# Altium schematic symbol library SCHLIB.SchLib: 2608 symbols (part 4 of 20) (continued)
## F-PTC FUSE (continued)
footprint F-2920
pins: 1, 2

## F-PTC FUSE 3A
designator F?, comment Termination: Radial  Trip Current: 6A  (hidden comment: 30R300UU)
PTC RESET FUSE 30V 3A RADIAL; Manufacturer: Littelfuse; Power Dissipation: 2W; Current Rating: 40A; Resistance: 80mR; Time to Trip: 10.8s; Approvals: cULus,TUV; Washability: OK; Supplier 1: Digi-Key; Supplier Part Number 1: F2026-ND; Manufacturer Part Number: 30R300UU; Stock 1: 2309; Pricing 1: 1=0.58, 5=0.562, 10=0.545, 50=0.4584, 100=0.3806, 250=0.346, 500=0.2941, 1000=0.2595, 5000=0.23355 (USD); Case/Package: Radial; Min Operating Temperature: -40°C; Max Operating Temperature: 85°C; Package Quantity: 500; Packaging: Bulk; Operating Supply Voltage: 30V; Max Current Rating: 40A; Max Voltage Rating (DC): 30V; Working Voltage: 30V; Voltage Rating (DC): 30V; Hold Current: 3A; Height: 7.27mm; Width: 11.4mm; Lead Pitch: 5.1mm; Thickness: 3.05mm; Lead Free: Lead Free; REACH SVHC: No SVHC; ComponentLink1URL: http://www.littelfuse.com/~/media/electronics/datasheets/resettable_ptcs/littelfuse_ptc_30r_datasheet.pdf.pdf?src-supplier=Digi-Key; ComponentLink1Description: http://www.littelfuse.com/~/media/electronics/datasheets/resettable_ptcs/littelfuse_ptc_30r_datasheet.pdf.pdf?src-supplier=Digi-Key; ComponentLink2URL: https://www.verical.com/server-webapp/html/getDatasheet?partID=228806&src-supplier=Verical; ComponentLink2Description: https://www.verical.com/server-webapp/html/getDatasheet?partID=228806&src-supplier=Verical; ComponentLink3URL: http://www.farnell.com/datasheets/578253.pdf?src-supplier=Element14; ComponentLink3Description: http://www.farnell.com/datasheets/578253.pdf?src-supplier=Element14; ComponentLink4URL: http://www.farnell.com/datasheets/656941.pdf?src-supplier=Element14; ComponentLink4Description: http://www.farnell.com/datasheets/656941.pdf?src-supplier=Element14
footprint Radial 5.1mm Lead (Poly Puse)
pins: 1, 2

## F-PTC-150mA-1206
designator F?, comment Hold Current: 50mA  Case/Package: 1206  (hidden comment: 150mA)
PTC RESET FUSE 60V 50MA 1206; Manufacturer: Bel; Manufacturer Part Number: 0ZCJ0005FF2E; Power Dissipation: 400mW; Max Current Rating: 10A; Time to Trip: 1.5s; Approvals: UL,TUV; Supplier 1: Digi-Key; Supplier Part Number 1: 507-1793-1-ND; Stock: 502454; Pricing: 1=0.11, 5=0.108, 10=0.104, 50=0.0928, 100=0.0864, 250=0.0768, 500=0.064, 1000=0.0608 (USD); RoHS: Yes; Mount: Surface Mount; Case Code (Metric): 3216; Contact Plating: Tin,Matte; Number of Terminals: 2; Case Code (Imperial): 1206; Min Operating Temperature: -40°C; Max Operating Temperature: 85°C; Max Voltage Rating (DC): 60V; Package Quantity: 1; Packaging: Tape and Reel; Trip Current: 150mA; Lead Free: Lead Free; ComponentLink1URL: https://datasheet.ciiva.com/18550/0zcj-18550517.pdf?src-supplier=Digi-Key; ComponentLink1Description: https://datasheet.ciiva.com/18550/0zcj-18550517.pdf?src-supplier=Digi-Key; ComponentLink2URL: https://datasheet.ciiva.com/18550/0zcj-18550518.pdf?src-supplier=Digi-Key; ComponentLink2Description: https://datasheet.ciiva.com/18550/0zcj-18550518.pdf?src-supplier=Digi-Key; ComponentLink3URL: https://datasheet.ciiva.com/18550/0zcj-18550519.pdf?src-supplier=Digi-Key; ComponentLink3Description: https://datasheet.ciiva.com/18550/0zcj-18550519.pdf?src-supplier=Digi-Key
footprint F-1206
pins: 1, 2

## F-PTC-160mA-1206
designator F?, comment 160mA  Case/Package: 1206
PTC RESET FUSE 48V 160MA 1206; Manufacturer: Bel; Manufacturer Part Number: 0ZCJ0016FF2E; Trip Current: 450mA; Time to Trip: 0.3s; Max Current Rating: 10A; Supplier 1: Avnet; Stock 1: 3000; Pricing 1: 3000=0,05539, 6000=0,05364, 12000=0,05112, 18000=0,04968, 24000=0,04788 (USD); RoHS: Yes; Mount: Surface Mount; Case Code (Imperial): 1206; Case Code (Metric): 3216; Contact Plating: Tin,Matte; Min Operating Temperature: -40°C; Max Operating Temperature: 85°C; Package Quantity: 1; Packaging: Tape and Reel; Lead Free: Lead Free; ComponentLink1URL: https://datasheet.ciiva.com/18550/0zcj-18550534.pdf?src-supplier=Digi-Key; ComponentLink1Description: https://datasheet.ciiva.com/18550/0zcj-18550534.pdf?src-supplier=Digi-Key; ComponentLink2URL: https://datasheet.ciiva.com/18550/0zcj-18550535.pdf?src-supplier=Digi-Key; ComponentLink2Description: https://datasheet.ciiva.com/18550/0zcj-18550535.pdf?src-supplier=Digi-Key; ComponentLink3URL: https://datasheet.ciiva.com/18550/0zcj-18550536.pdf?src-supplier=Digi-Key; ComponentLink3Description: https://datasheet.ciiva.com/18550/0zcj-18550536.pdf?src-supplier=Digi-Key; Supplier Part Number 1: 0ZCJ0016FF2E; Hold Current: 160mA
footprint L-1206
pins: 1, 2

## F-PTC-200mA
designator F?, comment Hold Current: 200mA  Case Code (Imperial): 1210  (hidden comment: MF-USMF020-2)
PTC RESET FUSE 30V 200MA 1210; Manufacturer: Bourns; Current Rating: 10A; Resistance: 5R; Power Dissipation: 600mW; Trip Current: 400mA; Time to Trip: 0.02s; Approvals: UL,CSA,TUV; Washability: OK; Supplier 1: Digi-Key; Manufacturer Part Number: MF-USMF020-2; Stock 1: 35052; Pricing 1: 1=0.37000, 5=0.35800, 10=0.34700, 50=0.29160, 100=0.24200, 250=0.22000, 500=0.18700, 1000=0.16500 (USD); RoHS: Yes; Mount: Surface Mount,PCB; Case/Package: 1210; Case Code (Metric): 3225; Number of Terminals: 2; Contact Plating: Gold; Terminal Material: Gold; Min Operating Temperature: -40°C; Max Operating Temperature: 85°C; Packaging: Tape and Reel; Package Quantity: 3000; Voltage Rating (DC): 30V; Max Current Rating: 10A; Operating Supply Voltage: 30V; Voltage Rating: 30V; Termination: SMD/SMT; Voltage Rating (AC): 30V; Length: 3.43mm; Height: 1.1mm; Width: 2.8mm; Radiation Hardening: No; REACH SVHC: No SVHC; Lead Free: Lead Free; ComponentLink1URL: https://datasheet.ciiva.com/34302/1164971-34302049.pdf?src-supplier=Jameco; ComponentLink1Description: https://datasheet.ciiva.com/34302/1164971-34302049.pdf?src-supplier=Jameco; ComponentLink2URL: https://datasheet.ciiva.com/326/mfusmf-326435.pdf?src-supplier=Digi-Key; ComponentLink2Description: https://datasheet.ciiva.com/326/mfusmf-326435.pdf?src-supplier=Digi-Key; ComponentLink3URL: https://datasheet.ciiva.com/326/mfusmf-326436.pdf?src-supplier=Digi-Key; ComponentLink3Description: https://datasheet.ciiva.com/326/mfusmf-326436.pdf?src-supplier=Digi-Key; ComponentLink4URL: https://datasheet.ciiva.com/326/mfusmf-326437.pdf?src-supplier=Digi-Key; ComponentLink4Description: https://datasheet.ciiva.com/326/mfusmf-326437.pdf?src-supplier=Digi-Key; ComponentLink5URL: https://datasheet.ciiva.com/3019/mfusmf-3019685.pdf?src-supplier=Avnet; ComponentLink5Description: https://datasheet.ciiva.com/3019/mfusmf-3019685.pdf?src-supplier=Avnet; ComponentLink6URL: https://datasheet.ciiva.com/8005/mfusmf-8005477.pdf?src-supplier=Element14; ComponentLink6Description: https://datasheet.ciiva.com/8005/mfusmf-8005477.pdf?src-supplier=Element14; ComponentLink7URL: https://datasheet.ciiva.com/3019/mfusmf-3019686.pdf?src-supplier=Avnet; ComponentLink7Description: https://datasheet.ciiva.com/3019/mfusmf-3019686.pdf?src-supplier=Avnet; ComponentLink8URL: https://datasheet.ciiva.com/30081/mfusmf-30081990.pdf?src-supplier=Onlinecomponents.com; ComponentLink8Description: https://datasheet.ciiva.com/30081/mfusmf-30081990.pdf?src-supplier=Onlinecomponents.com; ComponentLink9URL: https://datasheet.ciiva.com/32438/mf-usmf-series-eng-tds-32438758.pdf?src-supplier=Distrelec; ComponentLink9Description: https://datasheet.ciiva.com/32438/mf-usmf-series-eng-tds-32438758.pdf?src-supplier=Distrelec; ComponentLink10URL: https://datasheet.ciiva.com/46433/1869950-46433750.pdf?src-supplier=Element14; ComponentLink10Description: https://datasheet.ciiva.com/46433/1869950-46433750.pdf?src-supplier=Element14; ComponentLink11URL: https://datasheet.ciiva.com/46433/1869950-46433751.pdf?src-supplier=Element14; ComponentLink11Description: https://datasheet.ciiva.com/46433/1869950-46433751.pdf?src-supplier=Element14; ComponentLink12URL: https://datasheet.ciiva.com/22712/48621-22712232.pdf?src-supplier=Element14; ComponentLink12Description: https://datasheet.ciiva.com/22712/48621-22712232.pdf?src-supplier=Element14; ComponentLink13URL: https://datasheet.ciiva.com/14538/70153608-14538687.pdf?src-supplier=Allied+Electronics; ComponentLink13Description: https://datasheet.ciiva.com/14538/70153608-14538687.pdf?src-supplier=Allied+Electronics; Supplier Part Number 1: MF-USMF020-2CT-ND
footprint F-1210 (PTC Resettable Fuse, Body 3.215mmx2.575mm, BOURNS MF-USMF Series)
pins: 1, 2

## FB-BLM15AG100SH1D
designator FB?  Current Rating: 1A  Package: 0402
FERRITE BEAD 10 OHM 0402 1LN; Manufacturer Part Number: BLM15AG100SH1D; Manufacturer: Murata Electronics; Number of Lines: 1; Impedance @ Frequency: 10 Ohms @ 100 MHz; DCR: 50mOhm; Object  Type: Part; Design Item ID: FB-BLM15AG100SH1D; Series: BLM15; Filter Type: -; Ratings: AEC-Q200; Operating Temperature: -55°C ~ 125°C; Mounting Type: Surface Mount; Height: 0.55mm; Size: 1.00mm x 0.50mm; Category: Bead
footprint FB0402
pins: 1, 2

## FB-BLM15AG102SH1D
designator FB?  Current Rating: 200mA  Package: 0402
FERRITE BEAD 1 KOHM 0402 1LN; Manufacturer Part Number: BLM15AG102SH1D; Manufacturer: Murata Electronics; Number of Lines: 1; Impedance @ Frequency: 1 kOhms @ 100 MHz; DCR: 1Ohm; Object  Type: Part; Design Item ID: FB-BLM15AG102SH1D; Series: BLM15; Filter Type: -; Ratings: AEC-Q200; Operating Temperature: -55°C ~ 125°C; Mounting Type: Surface Mount; Height: 0.55mm; Size: 1.00mm x 0.50mm; Category: Bead
footprint FB0402
pins: 1, 2

## FB-BLM15AG102SZ1D
designator FB?  Current Rating: 300mA  Package: 0402
FERRITE BEAD 1 KOHM 0402 1LN; Manufacturer Part Number: BLM15AG102SZ1D; Manufacturer: Murata Electronics; Filter Type: Signal Line; Number of Lines: 1; Impedance @ Frequency: 1 kOhms @ 100 MHz; DCR: 650mOhm; Object  Type: Part; Design Item ID: FB-BLM15AG102SZ1D; Series: BLM15; Ratings: AEC-Q200; Operating Temperature: -55°C ~ 125°C; Mounting Type: Surface Mount; Height: 0.55mm; Size: 1.00mm x 0.50mm; Category: Bead
footprint FB0402
pins: 1, 2

## FB-BLM15AG121SH1D
designator FB?  Current Rating: 500mA  Package: 0402
FERRITE BEAD 120 OHM 0402 1LN; Manufacturer Part Number: BLM15AG121SH1D; Manufacturer: Murata Electronics; Number of Lines: 1; Impedance @ Frequency: 120 Ohms @ 100 MHz; DCR: 250mOhm; Object  Type: Part; Design Item ID: FB-BLM15AG121SH1D; Series: BLM15; Filter Type: -; Ratings: AEC-Q200; Operating Temperature: -55°C ~ 125°C; Mounting Type: Surface Mount; Height: 0.55mm; Size: 1.00mm x 0.50mm; Category: Bead
footprint FB0402
pins: 1, 2

## FB-BLM15AG221SH1D
designator FB?  Current Rating: 300mA  Package: 0402
FERRITE BEAD 220 OHM 0402 1LN; Manufacturer Part Number: BLM15AG221SH1D; Manufacturer: Murata Electronics; Number of Lines: 1; Impedance @ Frequency: 220 Ohms @ 100 MHz; DCR: 350mOhm; Object  Type: Part; Design Item ID: FB-BLM15AG221SH1D; Series: BLM15; Filter Type: -; Ratings: AEC-Q200; Operating Temperature: -55°C ~ 125°C; Mounting Type: Surface Mount; Height: 0.55mm; Size: 1.00mm x 0.50mm; Category: Bead
footprint FB0402
pins: 1, 2

## FB-BLM15AG601SH1D
designator FB?  Current Rating: 300mA  Package: 0402
FERRITE BEAD 600 OHM 0402 1LN; Manufacturer Part Number: BLM15AG601SH1D; Manufacturer: Murata Electronics; Number of Lines: 1; Impedance @ Frequency: 600 Ohms @ 100 MHz; DCR: 600mOhm; Object  Type: Part; Design Item ID: FB-BLM15AG601SH1D; Series: BLM15; Filter Type: -; Ratings: AEC-Q200; Operating Temperature: -55°C ~ 125°C; Mounting Type: Surface Mount; Height: 0.55mm; Size: 1.00mm x 0.50mm; Category: Bead
footprint FB0402
pins: 1, 2

## FB-BLM15AG700SH1D
designator FB?  Current Rating: 500mA  Package: 0402
FERRITE BEAD 70 OHM 0402 1LN; Manufacturer Part Number: BLM15AG700SH1D; Manufacturer: Murata Electronics; Number of Lines: 1; Impedance @ Frequency: 70 Ohms @ 100 MHz; DCR: 150mOhm; Object  Type: Part; Design Item ID: FB-BLM15AG700SH1D; Series: BLM15; Filter Type: -; Ratings: AEC-Q200; Operating Temperature: -55°C ~ 125°C; Mounting Type: Surface Mount; Height: 0.55mm; Size: 1.00mm x 0.50mm; Category: Bead
footprint FB0402
pins: 1, 2

## FB-BLM15AX102SZ1D
designator FB?  Current Rating: 350mA  Package: 0402
FERRITE BEAD 1 KOHM 0402 1LN; Manufacturer Part Number: BLM15AX102SZ1D; Manufacturer: Murata Electronics; Filter Type: Power, Signal Line; Number of Lines: 1; Impedance @ Frequency: 1 kOhms @ 100 MHz; DCR: 490mOhm; Object  Type: Part; Design Item ID: FB-BLM15AX102SZ1D; Series: BLM15; Ratings: AEC-Q200; Operating Temperature: -55°C ~ 125°C; Mounting Type: Surface Mount; Height: 0.55mm; Size: 1.00mm x 0.50mm; Category: Bead
footprint FB0402
pins: 1, 2

## FB-BLM15AX121SZ1D
designator FB?  Current Rating: 700mA  Package: 0402
FERRITE BEAD 120 OHM 0402 1LN; Manufacturer Part Number: BLM15AX121SZ1D; Manufacturer: Murata Electronics; Filter Type: Power, Signal Line; Number of Lines: 1; Impedance @ Frequency: 120 Ohms @ 100 MHz; DCR: 130mOhm; Object  Type: Part; Design Item ID: FB-BLM15AX121SZ1D; Series: BLM15; Ratings: AEC-Q200; Operating Temperature: -55°C ~ 125°C; Mounting Type: Surface Mount; Height: 0.55mm; Size: 1.00mm x 0.50mm; Category: Bead
footprint FB0402
pins: 1, 2

## FB-BLM15AX601SZ1D
designator FB?  Current Rating: 500mA  Package: 0402
FERRITE BEAD 600 OHM 0402 1LN; Manufacturer Part Number: BLM15AX601SZ1D; Manufacturer: Murata Electronics; Filter Type: Power, Signal Line; Number of Lines: 1; Impedance @ Frequency: 600 Ohms @ 100 MHz; DCR: 340mOhm; Object  Type: Part; Design Item ID: FB-BLM15AX601SZ1D; Series: BLM15; Ratings: AEC-Q200; Operating Temperature: -55°C ~ 125°C; Mounting Type: Surface Mount; Height: 0.55mm; Size: 1.00mm x 0.50mm; Category: Bead
footprint FB0402
pins: 1, 2

## FB-BLM15BD152SZ1D
designator FB?  Current Rating: 190mA  Package: 0402
FERRITE BEAD 1.5 KOHM 0402 1LN; Manufacturer Part Number: BLM15BD152SZ1D; Manufacturer: Murata Electronics; Number of Lines: 1; Impedance @ Frequency: 1.5 kOhms @ 100 MHz; DCR: 1Ohm; Object  Type: Part; Design Item ID: FB-BLM15BD152SZ1D; Series: BLM15; Filter Type: -; Ratings: AEC-Q200; Operating Temperature: -55°C ~ 125°C; Mounting Type: Surface Mount; Height: 0.55mm; Size: 1.00mm x 0.50mm; Category: Bead
footprint FB0402
pins: 1, 2

## FB-BLM15BD601SH1D
designator FB?  Current Rating: 200mA  Package: 0402
FERRITE BEAD 600 OHM 0402 1LN; Manufacturer Part Number: BLM15BD601SH1D; Manufacturer: Murata Electronics; Filter Type: Signal Line; Number of Lines: 1; Impedance @ Frequency: 600 Ohms @ 100 MHz; DCR: 650mOhm; Object  Type: Part; Design Item ID: FB-BLM15BD601SH1D; Series: BLM15; Ratings: AEC-Q200; Operating Temperature: -55°C ~ 125°C; Mounting Type: Surface Mount; Height: 0.55mm; Size: 1.00mm x 0.50mm; Category: Bead
footprint FB0402
pins: 1, 2

## FB-BLM15EG121SH1D
designator FB?  Current Rating: 1.5A  Package: 0402
FERRITE BEAD 120 OHM 0402 1LN; Manufacturer Part Number: BLM15EG121SH1D; Manufacturer: Murata Electronics; Filter Type: Power, Signal Line; Number of Lines: 1; Impedance @ Frequency: 120 Ohms @ 100 MHz; DCR: 95mOhm; Object  Type: Part; Design Item ID: FB-BLM15EG121SH1D; Series: BLM15; Ratings: AEC-Q200; Operating Temperature: -55°C ~ 125°C; Mounting Type: Surface Mount; Height: 0.55mm; Size: 1.00mm x 0.50mm; Category: Bead
footprint FB0402
pins: 1, 2

## FB-BLM15EG221SH1D
designator FB?  Current Rating: 700mA  Package: 0402
FERRITE BEAD 220 OHM 0402 1LN; Manufacturer Part Number: BLM15EG221SH1D; Manufacturer: Murata Electronics; Filter Type: Power, Signal Line; Number of Lines: 1; Impedance @ Frequency: 220 Ohms @ 100 MHz; DCR: 280mOhm; Object  Type: Part; Design Item ID: FB-BLM15EG221SH1D; Series: BLM15; Ratings: AEC-Q200; Operating Temperature: -55°C ~ 125°C; Mounting Type: Surface Mount; Height: 0.55mm; Size: 1.00mm x 0.50mm; Category: Bead
footprint FB0402
pins: 1, 2

## FB-BLM15GG471SZ1D
designator FB?  Current Rating: 200mA  Package: 0402
FERRITE BEAD 470 OHM 0402 1LN; Manufacturer Part Number: BLM15GG471SZ1D; Manufacturer: Murata Electronics; Filter Type: Signal Line; Number of Lines: 1; Impedance @ Frequency: 470 Ohms @ 100 MHz; DCR: 1.3Ohm; Object  Type: Part; Design Item ID: FB-BLM15GG471SZ1D; Series: BLM15; Ratings: AEC-Q200; Operating Temperature: -55°C ~ 125°C; Mounting Type: Surface Mount; Height: 0.55mm; Size: 1.00mm x 0.50mm; Category: Bead
footprint FB0402
pins: 1, 2

## FB-BLM15HB121SH1D
designator FB?  Current Rating: 300mA  Package: 0402
FERRITE BEAD 120 OHM 0402 1LN; Manufacturer Part Number: BLM15HB121SH1D; Manufacturer: Murata Electronics; Filter Type: Signal Line; Number of Lines: 1; Impedance @ Frequency: 120 Ohms @ 100 MHz; DCR: 700mOhm; Object  Type: Part; Design Item ID: FB-BLM15HB121SH1D; Series: BLM15; Ratings: AEC-Q200; Operating Temperature: -55°C ~ 125°C; Mounting Type: Surface Mount; Height: 0.55mm; Size: 1.00mm x 0.50mm; Category: Bead
footprint FB0402
pins: 1, 2

## FB-BLM15HB221SH1D
designator FB?  Current Rating: 250mA  Package: 0402
FERRITE BEAD 220 OHM 0402 1LN; Manufacturer Part Number: BLM15HB221SH1D; Manufacturer: Murata Electronics; Filter Type: Signal Line; Number of Lines: 1; Impedance @ Frequency: 220 Ohms @ 100 MHz; DCR: 1Ohm; Object  Type: Part; Design Item ID: FB-BLM15HB221SH1D; Series: BLM15; Ratings: AEC-Q200; Operating Temperature: -55°C ~ 125°C; Mounting Type: Surface Mount; Height: 0.55mm; Size: 1.00mm x 0.50mm; Category: Bead
footprint FB0402
pins: 1, 2

## FB-BLM15HD102BH1D
designator FB?  Current Rating: 250mA  Package: 0402
FERRITE BEAD 1 KOHM 0402 1LN; Manufacturer Part Number: BLM15HD102BH1D; Manufacturer: Murata Electronics; Filter Type: Signal Line; Number of Lines: 1; Impedance @ Frequency: 1 kOhms @ 100 MHz; DCR: 1.25Ohm; Object  Type: Part; Design Item ID: FB-BLM15HD102BH1D; Series: BLM15; Ratings: AEC-Q200; Operating Temperature: -55°C ~ 150°C; Mounting Type: Surface Mount; Height: 0.55mm; Size: 1.00mm x 0.50mm; Category: Bead
footprint FB0402
pins: 1, 2

## FB-BLM15HD182BH1D
designator FB?  Current Rating: 200mA  Package: 0402
FERRITE BEAD 1.8 KOHM 0402 1LN; Manufacturer Part Number: BLM15HD182BH1D; Manufacturer: Murata Electronics; Filter Type: Signal Line; Number of Lines: 1; Impedance @ Frequency: 1.8 kOhms @ 100 MHz; DCR: 2Ohm; Object  Type: Part; Design Item ID: FB-BLM15HD182BH1D; Series: BLM15; Ratings: AEC-Q200; Operating Temperature: -55°C ~ 150°C; Mounting Type: Surface Mount; Height: 0.55mm; Size: 1.00mm x 0.50mm; Category: Bead
footprint FB0402
pins: 1, 2

## FB-BLM15HD182SH1D
designator FB?  Current Rating: 200mA  Package: 0402
FERRITE BEAD 1.8 KOHM 0402 1LN; Manufacturer Part Number: BLM15HD182SH1D; Manufacturer: Murata Electronics; Filter Type: Signal Line; Number of Lines: 1; Impedance @ Frequency: 1.8 kOhms @ 100 MHz; DCR: 2.2Ohm; Object  Type: Part; Design Item ID: FB-BLM15HD182SH1D; Series: BLM15; Ratings: AEC-Q200; Operating Temperature: -55°C ~ 125°C; Mounting Type: Surface Mount; Height: 0.55mm; Size: 1.00mm x 0.50mm; Category: Bead
footprint FB0402
pins: 1, 2

## FB-BLM15HD182SZ1D
designator FB?  Current Rating: 200mA  Package: 0402
FERRITE BEAD 1.8 KOHM 0402 1LN; Manufacturer Part Number: BLM15HD182SZ1D; Manufacturer: Murata Electronics; Filter Type: Signal Line; Number of Lines: 1; DCR: 2.2Ohm; Object  Type: Part; Design Item ID: FB-BLM15HD182SZ1D; Series: BLM15; Impedance @ Frequency: -; Ratings: AEC-Q200; Operating Temperature: -55°C ~ 125°C; Mounting Type: Surface Mount; Height: 0.55mm; Size: 1.00mm x 0.50mm; Category: Bead
footprint FB0402
pins: 1, 2

## FB-BLM15HD601BH1D
designator FB?  Current Rating: 300mA  Package: 0402
FERRITE BEAD 600 OHM 0402 1LN; Manufacturer Part Number: BLM15HD601BH1D; Manufacturer: Murata Electronics; Filter Type: Signal Line; Number of Lines: 1; Impedance @ Frequency: 600 Ohms @ 100 MHz; DCR: 850mOhm; Object  Type: Part; Design Item ID: FB-BLM15HD601BH1D; Series: BLM15; Ratings: AEC-Q200; Operating Temperature: -55°C ~ 150°C; Mounting Type: Surface Mount; Height: 0.55mm; Size: 1.00mm x 0.50mm; Category: Bead
footprint FB0402
pins: 1, 2

## FB-BLM15HG102BH1D
designator FB?  Current Rating: 250mA  Package: 0402
FERRITE BEAD 1 KOHM 0402 1LN; Manufacturer Part Number: BLM15HG102BH1D; Manufacturer: Murata Electronics; Filter Type: Signal Line; Number of Lines: 1; Impedance @ Frequency: 1 kOhms @ 100 MHz; DCR: 1.1Ohm; Object  Type: Part; Design Item ID: FB-BLM15HG102BH1D; Series: BLM15; Ratings: AEC-Q200; Operating Temperature: -55°C ~ 125°C; Mounting Type: Surface Mount; Height: 0.55mm; Size: 1.00mm x 0.50mm; Category: Bead
footprint FB0402
pins: 1, 2

## FB-BLM15HG102SH1D
designator FB?  Current Rating: 250mA  Package: 0402
FERRITE BEAD 1 KOHM 0402 1LN; Manufacturer Part Number: BLM15HG102SH1D; Manufacturer: Murata Electronics; Filter Type: Signal Line; Number of Lines: 1; Impedance @ Frequency: 1 kOhms @ 100 MHz; DCR: 1.1Ohm; Object  Type: Part; Design Item ID: FB-BLM15HG102SH1D; Series: BLM15; Ratings: AEC-Q200; Operating Temperature: -55°C ~ 125°C; Mounting Type: Surface Mount; Height: 0.55mm; Size: 1.00mm x 0.50mm; Category: Bead
footprint FB0402
pins: 1, 2

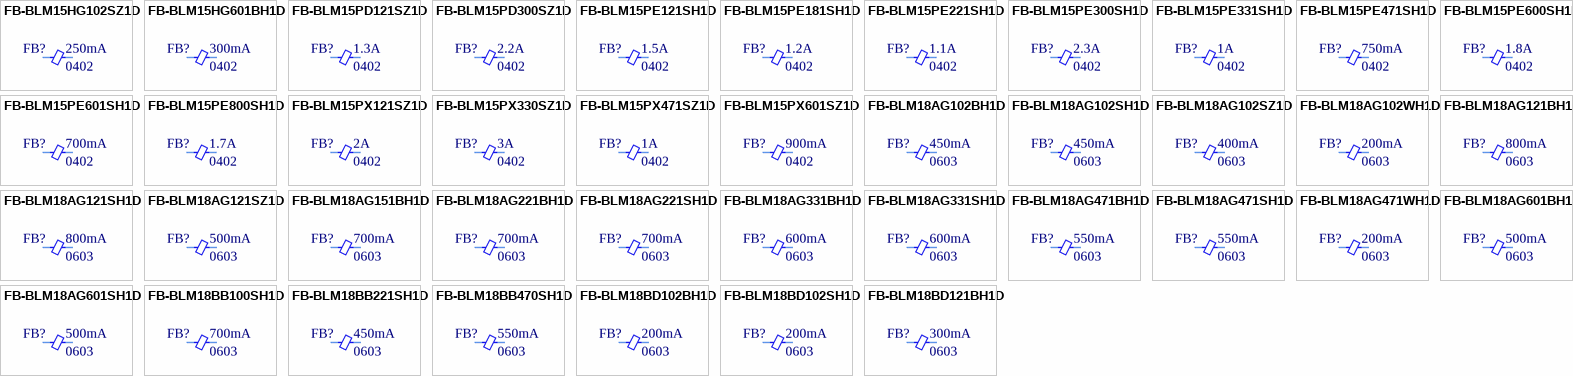
[diagram p13: symbols FB-BLM15HG102SZ1D to FB-BLM18BD121BH1D]

## FB-BLM15HG102SZ1D
designator FB?  Current Rating: 250mA  Package: 0402
FERRITE BEAD 1000 OHM 0402 1LN; Manufacturer Part Number: BLM15HG102SZ1D; Manufacturer: Murata Electronics; Filter Type: Signal Line; Number of Lines: 1; DCR: 1.1Ohm; Object  Type: Part; Design Item ID: FB-BLM15HG102SZ1D; Series: BLM15; Impedance @ Frequency: -; Ratings: AEC-Q200; Operating Temperature: -55°C ~ 125°C; Mounting Type: Surface Mount; Height: 0.55mm; Size: 1.00mm x 0.50mm; Category: Bead
footprint FB0402
pins: 1, 2

## FB-BLM15HG601BH1D
designator FB?  Current Rating: 300mA  Package: 0402
FERRITE BEAD 600 OHM 0402 1LN; Manufacturer Part Number: BLM15HG601BH1D; Manufacturer: Murata Electronics; Filter Type: Signal Line; Number of Lines: 1; Impedance @ Frequency: 600 Ohms @ 100 MHz; DCR: 700mOhm; Object  Type: Part; Design Item ID: FB-BLM15HG601BH1D; Series: BLM15; Ratings: AEC-Q200; Operating Temperature: -55°C ~ 125°C; Mounting Type: Surface Mount; Height: 0.55mm; Size: 1.00mm x 0.50mm; Category: Bead
footprint FB0402
pins: 1, 2

## FB-BLM15PD121SZ1D
designator FB?  Current Rating: 1.3A  Package: 0402
FERRITE BEAD 120 OHM 0402 1LN; Manufacturer Part Number: BLM15PD121SZ1D; Manufacturer: Murata Electronics; Filter Type: Power Line; Number of Lines: 1; Impedance @ Frequency: 120 Ohms @ 100 MHz; DCR: 90mOhm; Object  Type: Part; Design Item ID: FB-BLM15PD121SZ1D; Series: BLM15; Ratings: AEC-Q200; Operating Temperature: -55°C ~ 125°C; Mounting Type: Surface Mount; Height: 0.55mm; Size: 1.00mm x 0.50mm; Category: Bead
footprint FB0402
pins: 1, 2

## FB-BLM15PD300SZ1D
designator FB?  Current Rating: 2.2A  Package: 0402
FERRITE BEAD 30 OHM 0402 1LN; Manufacturer Part Number: BLM15PD300SZ1D; Manufacturer: Murata Electronics; Filter Type: Power Line; Number of Lines: 1; Impedance @ Frequency: 30 Ohms @ 100 MHz; DCR: 35mOhm; Object  Type: Part; Design Item ID: FB-BLM15PD300SZ1D; Series: BLM15; Ratings: AEC-Q200; Operating Temperature: -55°C ~ 125°C; Mounting Type: Surface Mount; Height: 0.55mm; Size: 1.00mm x 0.50mm; Category: Bead
footprint FB0402
pins: 1, 2

## FB-BLM15PE121SH1D
designator FB?  Current Rating: 1.5A  Package: 0402
FERRITE BEAD 120 OHM 0402 1LN; Manufacturer Part Number: BLM15PE121SH1D; Manufacturer: Murata Electronics; Filter Type: Power Line; Number of Lines: 1; Impedance @ Frequency: 120 Ohms @ 100 MHz; DCR: 90mOhm; Object  Type: Part; Design Item ID: FB-BLM15PE121SH1D; Series: BLM15; Ratings: AEC-Q200; Operating Temperature: -55°C ~ 125°C; Mounting Type: Surface Mount; Height: 0.55mm; Size: 1.00mm x 0.50mm; Category: Bead
footprint FB0402
pins: 1, 2

## FB-BLM15PE181SH1D
designator FB?  Current Rating: 1.2A  Package: 0402
FERRITE BEAD 180 OHM 0402 1LN; Manufacturer Part Number: BLM15PE181SH1D; Manufacturer: Murata Electronics; Filter Type: Power Line; Number of Lines: 1; Impedance @ Frequency: 180 Ohms @ 100 MHz; DCR: 140mOhm; Object  Type: Part; Design Item ID: FB-BLM15PE181SH1D; Series: BLM15; Ratings: AEC-Q200; Operating Temperature: -55°C ~ 125°C; Mounting Type: Surface Mount; Height: 0.55mm; Size: 1.00mm x 0.50mm; Category: Bead
footprint FB0402
pins: 1, 2

## FB-BLM15PE221SH1D
designator FB?  Current Rating: 1.1A  Package: 0402
FERRITE BEAD 220 OHM 0402 1LN; Manufacturer Part Number: BLM15PE221SH1D; Manufacturer: Murata Electronics; Filter Type: Power Line; Number of Lines: 1; Impedance @ Frequency: 220 Ohms @ 100 MHz; DCR: 170mOhm; Object  Type: Part; Design Item ID: FB-BLM15PE221SH1D; Series: BLM15; Ratings: AEC-Q200; Operating Temperature: -55°C ~ 125°C; Mounting Type: Surface Mount; Height: 0.55mm; Size: 1.00mm x 0.50mm; Category: Bead
footprint FB0402
pins: 1, 2

## FB-BLM15PE300SH1D
designator FB?  Current Rating: 2.3A  Package: 0402
FERRITE BEAD 30 OHM 0402 1LN; Manufacturer Part Number: BLM15PE300SH1D; Manufacturer: Murata Electronics; Filter Type: Power Line; Number of Lines: 1; Impedance @ Frequency: 30 Ohms @ 100 MHz; DCR: 35mOhm; Object  Type: Part; Design Item ID: FB-BLM15PE300SH1D; Series: BLM15; Ratings: AEC-Q200; Operating Temperature: -55°C ~ 125°C; Mounting Type: Surface Mount; Height: 0.55mm; Size: 1.00mm x 0.50mm; Category: Bead
footprint FB0402
pins: 1, 2

## FB-BLM15PE331SH1D
designator FB?  Current Rating: 1A  Package: 0402
FERRITE BEAD 330 OHM 0402 1LN; Manufacturer Part Number: BLM15PE331SH1D; Manufacturer: Murata Electronics; Filter Type: Power Line; Number of Lines: 1; Impedance @ Frequency: 330 Ohms @ 100 MHz; DCR: 210mOhm; Object  Type: Part; Design Item ID: FB-BLM15PE331SH1D; Series: BLM15; Ratings: AEC-Q200; Operating Temperature: -55°C ~ 125°C; Mounting Type: Surface Mount; Height: 0.55mm; Size: 1.00mm x 0.50mm; Category: Bead
footprint FB0402
pins: 1, 2

## FB-BLM15PE471SH1D
designator FB?  Current Rating: 750mA  Package: 0402
FERRITE BEAD 470 OHM 0402 1LN; Manufacturer Part Number: BLM15PE471SH1D; Manufacturer: Murata Electronics; Filter Type: Power Line; Number of Lines: 1; Impedance @ Frequency: 470 Ohms @ 100 MHz; DCR: 350mOhm; Object  Type: Part; Design Item ID: FB-BLM15PE471SH1D; Series: BLM15; Ratings: AEC-Q200; Operating Temperature: -55°C ~ 125°C; Mounting Type: Surface Mount; Height: 0.55mm; Size: 1.00mm x 0.50mm; Category: Bead
footprint FB0402
pins: 1, 2

## FB-BLM15PE600SH1D
designator FB?  Current Rating: 1.8A  Package: 0402
FERRITE BEAD 60 OHM 0402 1LN; Manufacturer Part Number: BLM15PE600SH1D; Manufacturer: Murata Electronics; Filter Type: Power Line; Number of Lines: 1; Impedance @ Frequency: 60 Ohms @ 100 MHz; DCR: 60mOhm; Object  Type: Part; Design Item ID: FB-BLM15PE600SH1D; Series: BLM15; Ratings: AEC-Q200; Operating Temperature: -55°C ~ 125°C; Mounting Type: Surface Mount; Height: 0.55mm; Size: 1.00mm x 0.50mm; Category: Bead
footprint FB0402
pins: 1, 2

## FB-BLM15PE601SH1D
designator FB?  Current Rating: 700mA  Package: 0402
FERRITE BEAD 600 OHM 0402 1LN; Manufacturer Part Number: BLM15PE601SH1D; Manufacturer: Murata Electronics; Filter Type: Power Line; Number of Lines: 1; Impedance @ Frequency: 600 Ohms @ 100 MHz; DCR: 400mOhm; Object  Type: Part; Design Item ID: FB-BLM15PE601SH1D; Series: BLM15; Ratings: AEC-Q200; Operating Temperature: -55°C ~ 125°C; Mounting Type: Surface Mount; Height: 0.55mm; Size: 1.00mm x 0.50mm; Category: Bead
footprint FB0402
pins: 1, 2

## FB-BLM15PE800SH1D
designator FB?  Current Rating: 1.7A  Package: 0402
FERRITE BEAD 80 OHM 0402 1LN; Manufacturer Part Number: BLM15PE800SH1D; Manufacturer: Murata Electronics; Filter Type: Power Line; Number of Lines: 1; Impedance @ Frequency: 80 Ohms @ 100 MHz; DCR: 70mOhm; Object  Type: Part; Design Item ID: FB-BLM15PE800SH1D; Series: BLM15; Ratings: AEC-Q200; Operating Temperature: -55°C ~ 125°C; Mounting Type: Surface Mount; Height: 0.55mm; Size: 1.00mm x 0.50mm; Category: Bead
footprint FB0402
pins: 1, 2

## FB-BLM15PX121SZ1D
designator FB?  Current Rating: 2A  Package: 0402
FERRITE BEAD 120 OHM 0402 1LN; Manufacturer Part Number: BLM15PX121SZ1D; Manufacturer: Murata Electronics; Filter Type: Power Line; Number of Lines: 1; Impedance @ Frequency: 120 Ohms @ 100 MHz; DCR: 55mOhm; Object  Type: Part; Design Item ID: FB-BLM15PX121SZ1D; Series: BLM15; Ratings: AEC-Q200; Operating Temperature: -55°C ~ 125°C; Mounting Type: Surface Mount; Height: 0.55mm; Size: 1.00mm x 0.50mm; Category: Bead
footprint FB0402
pins: 1, 2

## FB-BLM15PX330SZ1D
designator FB?  Current Rating: 3A  Package: 0402
FERRITE BEAD 33 OHM 0402 1LN; Manufacturer Part Number: BLM15PX330SZ1D; Manufacturer: Murata Electronics; Filter Type: Power Line; Number of Lines: 1; Impedance @ Frequency: 33 Ohms @ 100 MHz; DCR: 22mOhm; Object  Type: Part; Design Item ID: FB-BLM15PX330SZ1D; Series: BLM15; Ratings: AEC-Q200; Operating Temperature: -55°C ~ 125°C; Mounting Type: Surface Mount; Height: 0.55mm; Size: 1.00mm x 0.50mm; Category: Bead
footprint FB0402
pins: 1, 2

## FB-BLM15PX471SZ1D
designator FB?  Current Rating: 1A  Package: 0402
FERRITE BEAD 470 OHM 0402 1LN; Manufacturer Part Number: BLM15PX471SZ1D; Manufacturer: Murata Electronics; Filter Type: Power Line; Number of Lines: 1; Impedance @ Frequency: 470 Ohms @ 100 MHz; DCR: 200mOhm; Object  Type: Part; Design Item ID: FB-BLM15PX471SZ1D; Series: BLM15; Ratings: AEC-Q200; Operating Temperature: -55°C ~ 125°C; Mounting Type: Surface Mount; Height: 0.55mm; Size: 1.00mm x 0.50mm; Category: Bead
footprint FB0402
pins: 1, 2

## FB-BLM15PX601SZ1D
designator FB?  Current Rating: 900mA  Package: 0402
FERRITE BEAD 600 OHM 0402 1LN; Manufacturer Part Number: BLM15PX601SZ1D; Manufacturer: Murata Electronics; Filter Type: Power Line; Number of Lines: 1; Impedance @ Frequency: 600 Ohms @ 100 MHz; DCR: 230mOhm; Object  Type: Part; Design Item ID: FB-BLM15PX601SZ1D; Series: BLM15; Ratings: AEC-Q200; Operating Temperature: -55°C ~ 125°C; Mounting Type: Surface Mount; Height: 0.55mm; Size: 1.00mm x 0.50mm; Category: Bead
footprint FB0402
pins: 1, 2

## FB-BLM18AG102BH1D
designator FB?  Current Rating: 450mA  Package: 0603
FERRITE BEAD 1 KOHM 0603 1 LN; Manufacturer Part Number: BLM18AG102BH1D; Manufacturer: Murata Electronics; Filter Type: Power Line; Number of Lines: 1; Impedance @ Frequency: 1 kOhms @ 100 MHz; DCR: 500mOhm; Object  Type: Part; Design Item ID: FB-BLM18AG102BH1D; Series: BLM18; Ratings: AEC-Q200; Operating Temperature: -55°C ~ 150°C; Mounting Type: Surface Mount; Height: 0.95mm; Size: 1.60mm x 0.80mm; Category: Bead
footprint FB0603
pins: 1, 2

## FB-BLM18AG102SH1D
designator FB?  Current Rating: 450mA  Package: 0603
FERRITE BEAD 1 KOHM 0603 1LN; Manufacturer Part Number: BLM18AG102SH1D; Manufacturer: Murata Electronics; Number of Lines: 1; Impedance @ Frequency: 1 kOhms @ 100 MHz; DCR: 500mOhm; Object  Type: Part; Design Item ID: FB-BLM18AG102SH1D; Series: BLM18; Filter Type: -; Ratings: AEC-Q200; Operating Temperature: -55°C ~ 125°C; Mounting Type: Surface Mount; Height: 0.95mm; Size: 1.60mm x 0.80mm; Category: Bead
footprint FB0603
pins: 1, 2

## FB-BLM18AG102SZ1D
designator FB?  Current Rating: 400mA  Package: 0603
FERRITE BEAD 1 KOHM 0603 1LN; Manufacturer Part Number: BLM18AG102SZ1D; Manufacturer: Murata Electronics; Filter Type: Signal Line; Number of Lines: 1; Impedance @ Frequency: 1 kOhms @ 100 MHz; DCR: 500mOhm; Object  Type: Part; Design Item ID: FB-BLM18AG102SZ1D; Series: BLM18; Ratings: AEC-Q200; Operating Temperature: -55°C ~ 125°C; Mounting Type: Surface Mount; Height: 0.95mm; Size: 1.60mm x 0.80mm; Category: Bead
footprint FB0603
pins: 1, 2

## FB-BLM18AG102WH1D
designator FB?  Current Rating: 200mA  Package: 0603
FERRITE BEAD 1 KOHM 0603 1LN; Manufacturer Part Number: BLM18AG102WH1D; Manufacturer: Murata Electronics; Number of Lines: 1; Impedance @ Frequency: 1 kOhms @ 100 MHz; DCR: 700mOhm; Object  Type: Part; Design Item ID: FB-BLM18AG102WH1D; Series: BLM18; Filter Type: -; Ratings: AEC-Q200; Operating Temperature: -55°C ~ 150°C; Mounting Type: Surface Mount, Epoxy; Height: 0.95mm; Size: 1.60mm x 0.80mm; Category: Bead
footprint FB0603
pins: 1, 2

## FB-BLM18AG121BH1D
designator FB?  Current Rating: 800mA  Package: 0603